# Altium footprint library Electronic Devices_LIB.PcbLib: 410 footprints (part 26 of 26)
Each footprint in its own frame and in the unit in brackets; x right, y up, seen from the top. Pads: shape width x height; smd on the part's side, far side on the other; paste and mask are expansions set on the pad; w line width, h text height; cw(c..) or ccw(c..) is an arc to the next point about the centre after c.
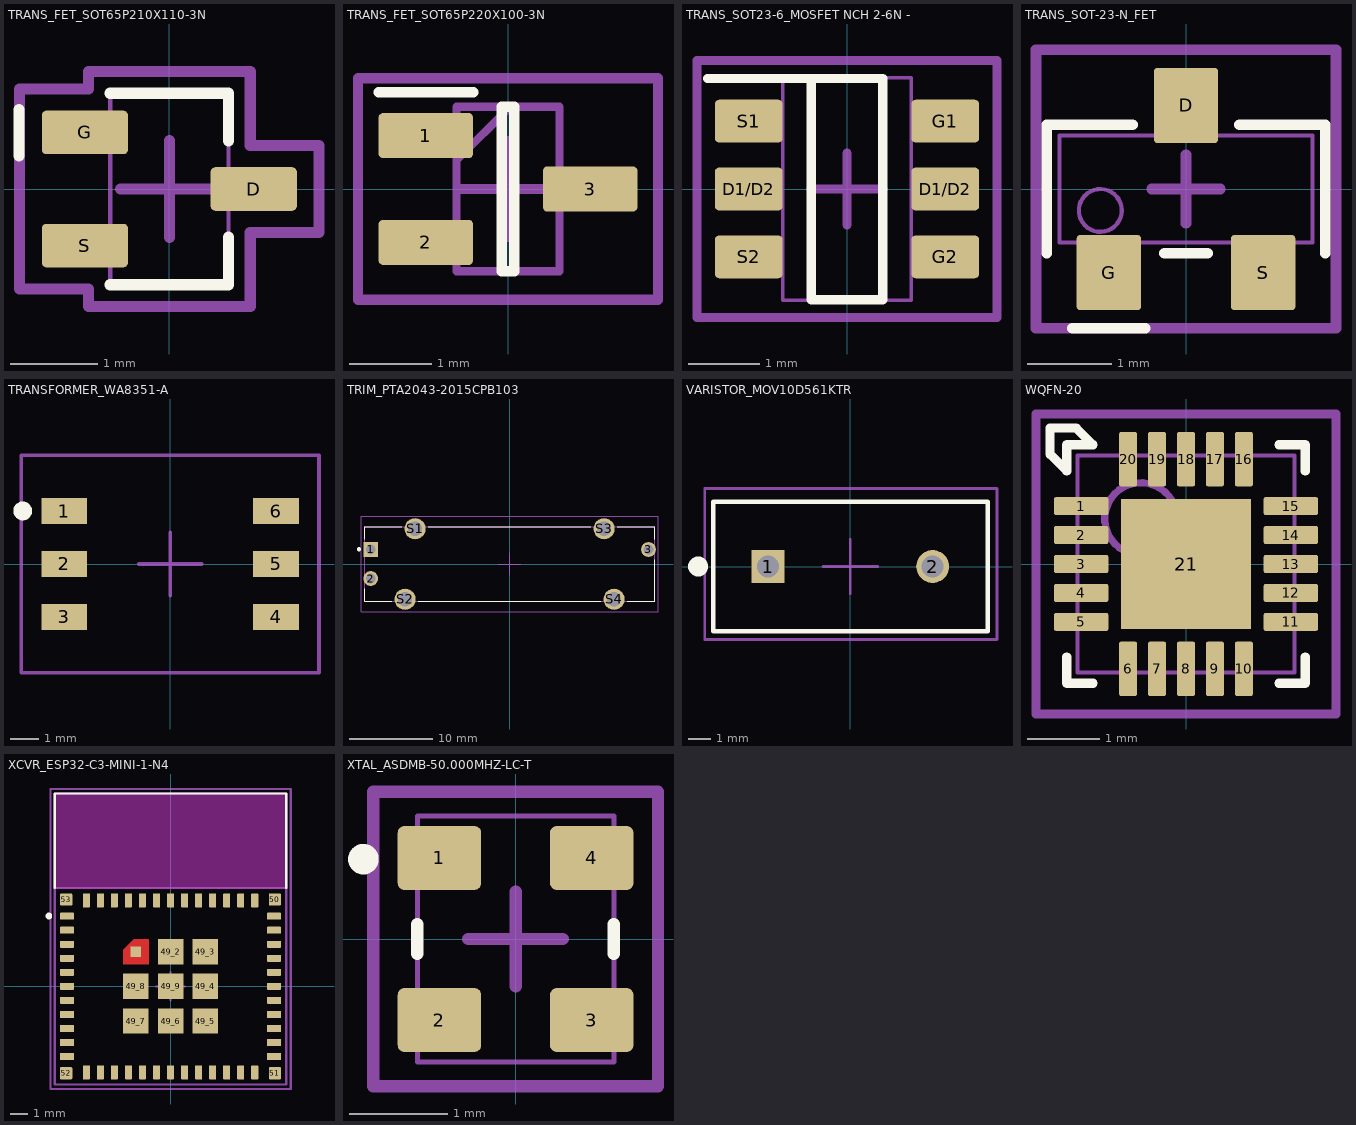
[diagram p25: the footprints below, top view; thin cyan lines are the x and y axes]

## TRANS_FET_SOT65P210X110-3N [mm] "SC-70, SOT-323"
height 1.1
pads (3):
  rrect20% 0.99x0.5 smd: D(0.97,0) G(-0.97,0.65) S(-0.97,-0.65)
Top Overlay:
  lines w0.127: -1.727,0.381 -1.727,0.914 ; -0.68,-1.1 0.68,-1.1 0.68,-0.55 ; -0.68,1.1 0.68,1.1 0.68,0.55
Top Assembly:
  lines w0.051: -0.68,-1.1 0.68,-1.1 0.68,1.1 -0.68,1.1 -0.68,-1.1
  text ".Designator" at -2.565,-0.136 h0.51
Top Courtyard:
  lines w0.127: -0.559,0 0,0 ; 0,-0.559 0,0 ; 0,0.559 0,0 ; 0.559,0 0,0 ; -1.72,-1.15 -1.72,1.15 -0.93,1.15 -0.93,1.35 0.93,1.35 0.93,0.5 1.72,0.5 1.72,-0.5 0.93,-0.5 0.93,-1.35 -0.93,-1.35 -0.93,-1.15 -1.72,-1.15
3D body "NX3008NBKW,115--3DModel-STEP-56544.STEP": height 1.01, standoff -0.09, extent -1.05,-1 1.05,1

## TRANS_FET_SOT65P220X100-3N [mm]
pads (3):
  rrect20% 1.15x0.55 smd: 1(-1,0.65) 2(-1,-0.65) 3(1,0)
Top Overlay:
  lines w0.127: -1.575,1.175 -0.425,1.175 ; -0.075,-1 0.075,-1 0.075,1 -0.075,1 -0.075,-1
Top Courtyard:
  lines w0.127: -0.584,0 0,0 ; 0,-0.584 0,0 ; 0,0.584 0,0 ; 0.584,0 0,0 ; -1.825,-1.35 1.825,-1.35 1.825,1.35 -1.825,1.35 -1.825,-1.35
Top 3D Body:
  lines w0.1: -0.625,0.35 0.025,1 ; -0.625,-1 0.625,-1 0.625,1 -0.625,1 -0.625,-1
3D body "NTS2101PT1G.stp": height 1, standoff 0, extent -1.1,-1 1.1,1

## TRANS_SOT23-6_MOSFET NCH 2-6N - [mm] "SOT23, 6-Leads, Body 2.92x2.80mm, Pitch 0.95mm, IPC Medium Density"
height 1.35
pads (6):
  rrect20% 0.95x0.6 smd: D1/D2(-1.375,0) D1/D2(1.375,0) G1(1.375,0.95) G2(1.375,-0.95) S1(-1.375,0.95) S2(-1.375,-0.95)
Top Overlay:
  lines w0.127: -1.955,1.55 -0.5,1.55 ; -0.5,1.55 0.5,1.55 0.5,-1.55 -0.5,-1.55 -0.5,1.55
Top Assembly:
  lines w0.051: -0.9,-1.56 -0.9,1.56 0.9,1.56 0.9,-1.56 -0.9,-1.56
  text ".Designator" at -2.515,-0.136 h0.51
Top Courtyard:
  lines w0.127: -0.5,0 0.5,0 ; 0,-0.5 0,0.5 ; -2.1,-1.8 -2.1,1.8 2.1,1.8 2.1,-1.8 -2.1,-1.8
3D body "IC_SOT23-6_RF_SOT95P280X135-6N.step": height 1.35, standoff 0, extent -1.5,-1.56 1.5,1.56

## TRANS_SOT-23-N_FET [mil] "SOT-23 FET Normal Density"
height 39.37
pads (3):
  rrect10% 30x35 smd: D(0,39) G(-36,-39) S(36,-39)
Top Overlay:
  lines w5: -65,-30 -65,30 -25,30 ; -53,-65 -19,-65 ; -10,-30 10,-30 ; 25,30 65,30 65,-30
Top Assembly:
  circle w2: c-40,-10 r10
  lines w2: -59.06,-25 -59.06,25 59.06,25 59.06,-25 -59.06,-25
  text ".Designator" at -95,-2.34 h20
Top Courtyard:
  lines w5: -16,0 0,0 ; 0,-16 0,0 ; 0,16 0,0 ; 16,0 0,0 ; -70,-65 70,-65 70,65 -70,65 -70,-65
3D body "SOT-23.step": height 41.65, standoff -1.65, extent -59.06,-51.66 59.06,46.77

## TRANSFORMER_WA8351-A [mm]
height 5.4
pads (6):
  rect 1.6x0.9 smd: 1(-3.7,1.85) 2(-3.7,0) 3(-3.7,-1.85) 4(3.7,-1.85) 5(3.7,0) 6(3.7,1.85)
Top Overlay:
  circle w0.4: c-5.156,1.854 r0.127
Top Courtyard:
  lines w0.127: -1.1,0 0,0 ; 0,-1.1 0,0 ; 0,1.1 0,0 ; 1.1,0 0,0 ; -5.2,-3.8 5.2,-3.8 5.2,3.8 -5.2,3.8 -5.2,3.6 -5.2,-3.8
3D body "Coilcraft-WA8351-AL.STEP": height 5.41, standoff 0.01, extent -3.85,-3.3 3.85,3.3

## TRIM_PTA2043-2015CPB103 [mm]
height 16.9
pads (7):
  rect 1.8x1.8 / inner round 1.8 / far side rect 1.8x1.8 hole 1.2: 1(-16.75,1.75)
  round 1.8 hole 1.2: 2(-16.75,-1.75) 3(16.75,1.75)
  round 2.55 hole 1.7: S1(-11.4,4.25) S2(-12.6,-4.25) S3(11.4,4.25) S4(12.6,-4.25)
Top Overlay:
  circle w0.3: c-18.186,1.778 r0.1
  lines w0.127: -17.5,-2.97 -17.5,-4.5 -14.195,-4.5 ; -17.5,2.97 -17.5,4.5 -12.995,4.5 ; -11.005,-4.5 11.005,-4.5 ; -9.805,4.5 9.805,4.5 ; 12.995,4.5 17.5,4.5 17.5,2.97 ; 14.195,-4.5 17.5,-4.5 17.5,0.53
Top Assembly:
  text ".Designator" at -2.464,-0.059 h0.51
Top Courtyard:
  lines w0.127: -1.346,0 0,0 ; 0,-1.346 0,0 ; 0,1.346 0,0 ; 1.346,0 0,0 ; -17.9,-5.775 -17.9,5.775 17.9,5.775 17.9,-5.775 -17.9,-5.775
Top 3D Body:
  lines w0.127: -17.5,-4.5 -17.5,4.5 17.5,4.5 17.5,-4.5 -17.5,-4.5

## VARISTOR_MOV10D561KTR [mm]
pads (2):
  rect 1.5x1.5 hole 1: 1(-3.75,0)
  round 1.5 hole 1: 2(3.75,0)
Top Overlay:
  lines w0.2: -6.25,-2.95 6.25,-2.95 6.25,2.95 -6.25,2.95 -6.25,-2.95
  lines w0.8: -6.984,0 ccw(c-6.934,0) -6.884,0 ccw(c-6.934,0) -6.984,0
Top Assembly:
  lines w0.051: -6.25,-2.95 6.25,-2.95 6.25,2.95 -6.25,2.95 -6.25,-2.95
  text ".Designator" at -2.226,-0.11 h0.51
Top Courtyard:
  lines w0.127: -1.245,0 0,0 ; 0,-1.245 0,0 ; 0,1.245 0,0 ; 1.245,0 0,0 ; -6.629,-3.327 6.68,-3.327 6.68,3.556 -6.629,3.556 -6.629,-3.327
3D body "MOV-10D561KTR.STEP": height 15.51, standoff -16.99, extent -6.174,-2.051 6.326,1.949

## WQFN-20 [mm] "QFN, 20-Leads, Body 3.00x3.00mm, Pitch 0.40mm, Thermal Pad 1.80x1.80mm, IPC Medium Density"
height 0.6
pads (21):
  rrect20% 0.75x0.25 smd mask+0.076: 1(-1.45,0.8) 2(-1.45,0.4) 3(-1.45,0) 4(-1.45,-0.4) 5(-1.45,-0.8) 11(1.45,-0.8) 12(1.45,-0.4) 13(1.45,0) 14(1.45,0.4) 15(1.45,0.8)
  rrect20% 0.25x0.75 smd mask+0.076: 6(-0.8,-1.45) 7(-0.4,-1.45) 8(0,-1.45) 9(0.4,-1.45) 10(0.8,-1.45) 16(0.8,1.45) 17(0.4,1.45) 18(0,1.45) 19(-0.4,1.45) 20(-0.8,1.45)
  rect 1.8x1.8 smd mask+0.076: 21(0,0)
Top Overlay:
  lines w0.127: -1.65,-1.289 -1.65,-1.65 -1.288,-1.65 ; 1.289,-1.65 1.65,-1.65 1.65,-1.289 ; 1.289,1.65 1.65,1.65 1.65,1.288 ; -1.88,1.518 -1.65,1.288 -1.65,1.65 -1.288,1.65 -1.518,1.88 -1.518,1.883 -1.88,1.883 -1.88,1.521 -1.88,1.518
Top Assembly:
  circle w0.1: c-0.625,0.625 r0.5
  lines w0.051: -1.5,-1.5 1.5,-1.5 1.5,1.5 -1.5,1.5 -1.5,-1.5
Top Courtyard:
  lines w0.1: -0.5,0 0.5,0 ; 0,-0.5 0,0.5
  lines w0.127: -2.075,-2.075 2.075,-2.075 2.075,2.075 -2.075,2.075 -2.075,-2.075
3D body "QFN40P300X300X60_HS-21N.step": height 0.6, standoff 0, extent -1.51,-1.51 1.51,1.51

## XCVR_ESP32-C3-MINI-1-N4 [mm]
height 2.55
pads (61):
  rrect20% 0.8x0.4 smd: 1(-5.9,4) 2(-5.9,3.2) 3(-5.9,2.4) 4(-5.9,1.6) 5(-5.9,0.8) 6(-5.9,0) 7(-5.9,-0.8) 8(-5.9,-1.6) 9(-5.9,-2.4) 10(-5.9,-3.2) 11(-5.9,-4) 25(5.9,-4) 26(5.9,-3.2) 27(5.9,-2.4) 28(5.9,-1.6) 29(5.9,-0.8) 30(5.9,0) 31(5.9,0.8) 32(5.9,1.6) 33(5.9,2.4) 34(5.9,3.2) 35(5.9,4)
  rrect20% 0.4x0.8 smd: 12(-4.8,-4.9) 13(-4,-4.9) 14(-3.2,-4.9) 15(-2.4,-4.9) 16(-1.6,-4.9) 17(-0.8,-4.9) 18(0,-4.9) 19(0.8,-4.9) 20(1.6,-4.9) 21(2.4,-4.9) 22(3.2,-4.9) 23(4,-4.9) 24(4.8,-4.9) 36(4.8,4.9) 37(4,4.9) 38(3.2,4.9) 39(2.4,4.9) 40(1.6,4.9) 41(0.8,4.9) 42(0,4.9) 43(-0.8,4.9) 44(-1.6,4.9) 45(-2.4,4.9) 46(-3.2,4.9) 47(-4,4.9) 48(-4.8,4.9)
  rect 0.6x0.6 smd paste-1 mask+0: 49_1(-1.975,1.975)
  rect 1.45x1.45 smd: 49_2(0,1.975) 49_3(1.975,1.975) 49_4(1.975,0) 49_5(1.975,-1.975) 49_6(0,-1.975) 49_7(-1.975,-1.975) 49_8(-1.975,0) 49_9(0,0)
  rrect20% 0.7x0.7 smd: 50(5.95,4.95) 51(5.95,-4.95) 52(-5.95,-4.95) 53(-5.95,4.95)
Top Layer:
  region: -1.25,1.25 -2.7,1.25 -2.7,2.1 -2.1,2.7 -1.25,2.7
Top Overlay:
  circle w0.2: c-6.934,4.013 r0.092
  lines w0.127: -6.6,5.62 -6.6,11 6.6,11 6.6,5.62
Top Paste:
  region: -1.25,1.25 -2.7,1.25 -2.7,2.1 -2.1,2.7 -1.25,2.7
Top Solder:
  region: -1.15,1.15 -2.8,1.15 -2.8,2.14 -2.14,2.8 -1.15,2.8
Keep-Out Layer:
  region: 6.6,5.6 -6.6,5.6 -6.6,11 6.6,11
  region: 6.6,5.6 -6.6,5.6 -6.6,11 6.6,11
Top Assembly:
  lines w0.127: -6.6,5.6 -6.6,-5.6 6.6,-5.6 6.6,5.6 ; -6.6,5.6 6.6,5.6 ; -6.6,5.6 -6.6,11 6.6,11 6.6,5.6
  text ".Designator" at -2.337,0.017 h0.51
Top Courtyard:
  lines w0.127: -0.813,0 0,0 ; 0,-0.813 0,0 ; 0,0.813 0,0 ; 0.813,0 0,0 ; -6.85,-5.85 6.85,-5.85 6.85,11.25 -6.85,11.25 -6.85,-5.85
3D body "step_temp.STEP": height 2.55, standoff 0, extent -6.6,-5.6 6.6,11

## XTAL_ASDMB-50.000MHZ-LC-T [mm]
height 0.9
pads (4):
  rrect20% 0.85x0.65 smd: 1(-0.775,0.825) 2(-0.775,-0.825) 3(0.775,-0.825) 4(0.775,0.825)
Top Overlay:
  circle w0.2: c-1.549,0.813 r0.055
  lines w0.127: -1,-0.15 -1,0.15 ; 1,-0.15 1,0.15
Top Assembly:
  lines w0.051: -1,-1.25 -1,1.25 1,1.25 1,-1.25 -1,-1.25
  text ".Designator" at -2.438,-0.136 h0.51
Top Courtyard:
  lines w0.127: -0.483,0 0,0 ; 0,-0.483 0,0 ; 0,0.483 0,0 ; 0.483,0 0,0 ; -1.45,-1.5 -1.45,1.5 1.45,1.5 1.45,-1.5 -1.45,-1.5
3D body "ASDMB-50.000MHZ-LC-T.step": height 0.91, standoff 0.01, extent -1,-1.25 1,1.25